# Altium footprint library 00.PcbLib: 150 footprints (part 2 of 10)
Each footprint in its own frame and in the unit in brackets; x right, y up, seen from the top. Pads: shape width x height; smd on the part's side, far side on the other; paste and mask are expansions set on the pad; w line width, h text height; cw(c..) or ccw(c..) is an arc to the next point about the centre after c.
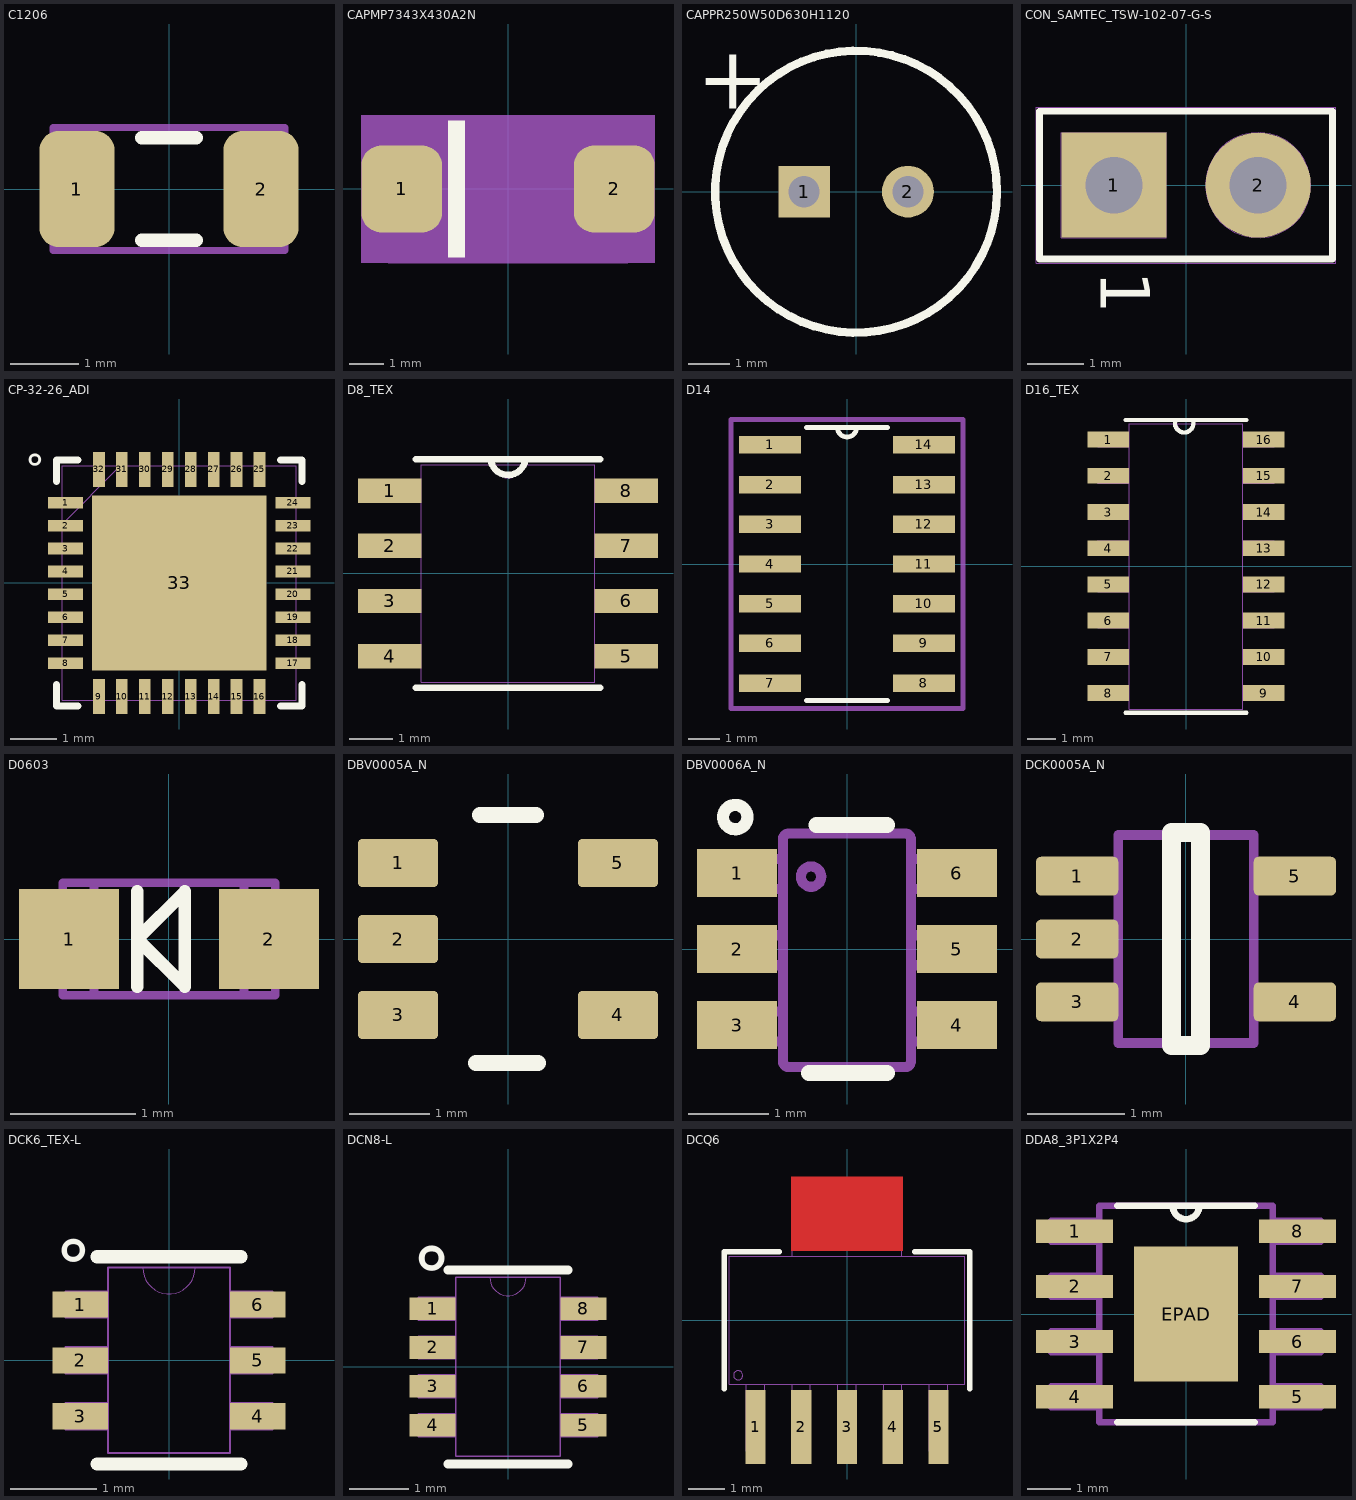
[diagram p1: the footprints below, top view; thin cyan lines are the x and y axes]

## C1206 [mm] "Chip Capacitor, Body 3.2x1.6mm, IPC High Density"
height 1.3
pads (2):
  rrect50% 1.1x1.7 smd: 1(-1.35,0) 2(1.35,0)
Top Overlay:
  lines w0.2: -0.4,-0.75 0.4,-0.75 ; -0.4,0.75 0.4,0.75
Top 3D Body:
  lines w0.1: -1.7,-0.9 -1.7,0.9 1.7,0.9 1.7,-0.9 -1.7,-0.9
3D body: height 1.3, standoff 0, extent -1.7,-0.9 1.7,0.9

## CAPMP7343X430A2N [mm] "CAPMP7343X430A2N"
pads (2):
  rrect50% 2.351x2.551 smd: 1(-3.1,0) 2(3.1,0)
Top Overlay:
  region: -1.25,-2 -1.25,2 -1.75,2 -1.75,-2
Top 3D Body:
  region: -3.65,1.2 -3.65,-1.2 -3.5,-1.2 -3.5,1.2
  region: 3.65,1.2 3.65,-1.2 3.5,-1.2 3.5,1.2
Top Component Outline (Mech100):
  dashed: -3.5,2.15 -3.5,-2.15 -2.5,-2.15 -2.5,2.15
  dashed: -4.275,-2.15 4.275,-2.15 4.275,2.15 -4.275,2.15
  lines w0.025: -3.5,-1.2 -3.55,-1.2 -3.65,-1.2 -3.65,1.2 -3.55,1.2 -3.5,1.2 ; 3.5,-1.2 3.55,-1.2 3.65,-1.2 3.65,1.2 3.55,1.2 3.5,1.2 ; -2.5,-2.15 3.5,-2.15 3.5,2.15 -2.5,2.15 ; -2.5,-2.15 -2.5,2.15 ; -2.5,-2.15 -3.5,-2.15 -3.5,2.15 -2.5,2.15
3D body: height 3.81, standoff 0, extent -3.65,-1.2 -3.5,1.2
3D body: height 3.81, standoff 0, extent 3.5,-1.2 3.65,1.2
3D body: height 3.81, standoff 0, extent -3.5,-2.15 3.5,2.15

## CAPPR250W50D630H1120 [mm]
pads (2):
  rect 1.25x1.25 hole 0.75: 1(-1.25,0)
  round 1.25 hole 0.75: 2(1.25,0)
Top Overlay:
  circle w0.2: c0,0 r3.4
  text "+" at -3.835,2.007 h1.52
3D body "CAPPR250W50D630H1120.stp": height 12.21, standoff -4.5, extent -3.4,-3.4 3.41,3.4

## CON_SAMTEC_TSW-102-07-G-S [mm]
pads (2):
  rect 1.85x1.85 / inner round 1.85 / far side rect 1.85x1.85 hole 1 mask+0.05: 1(-1.27,0)
  round 1.85 hole 1 mask+0.05: 2(1.27,0)
Top Overlay:
  lines w0.12: -2.58,-1.3 2.58,-1.3 2.58,1.3 -2.58,1.3 -2.58,-1.3
  text "1" at -1.795,-1.505 h1.5
Bottom 3D Body:
  circle w0.01: c1.27,0 r0.925
  lines w0.01: -2.64,-1.37 2.64,-1.37 2.64,1.37 -2.64,1.37 -2.64,-1.37 ; -2.195,-0.925 -2.195,0.925 -0.345,0.925 -0.345,-0.925 -2.195,-0.925
  text "1" at -1.525,-0.525 h1.5
3D body "TSW-102-07-G-S.stp": height 8.38, standoff -2.54, extent -2.667,-1.27 2.54,1.27
3D body: height 8.38, standoff 0, extent -2.579,-1.299 2.579,1.299

## CP-32-26_ADI [mil]
pads (33):
  rect 30x10 smd paste+0 mask+0: 1(-97.5,68.9) 2(-97.5,49.21) 3(-97.5,29.53) 4(-97.5,9.84) 5(-97.5,-9.84) 6(-97.5,-29.53) 7(-97.5,-49.21) 8(-97.5,-68.9) 17(97.5,-68.9) 18(97.5,-49.21) 19(97.5,-29.53) 20(97.5,-9.84) 21(97.5,9.84) 22(97.5,29.53) 23(97.5,49.21) 24(97.5,68.9)
  rect 10x30 smd paste+0 mask+0: 9(-68.9,-97.5) 10(-49.21,-97.5) 11(-29.53,-97.5) 12(-9.84,-97.5) 13(9.84,-97.5) 14(29.53,-97.5) 15(49.21,-97.5) 16(68.9,-97.5) 25(68.9,97.5) 26(49.21,97.5) 27(29.53,97.5) 28(9.84,97.5) 29(-9.84,97.5) 30(-29.53,97.5) 31(-49.21,97.5) 32(-68.9,97.5)
  rect 150x150 smd paste-74.5 mask+0: 33(0,0)
Top Overlay:
  lines w6: -105.5,-87 -105.5,-105.5 -87,-105.5 ; -105.5,87 -105.5,105.5 -87,105.5 ; 87,-105.5 105.5,-105.5 105.5,-87 ; 87,105.5 105.5,105.5 105.5,87
  text "。" at -130,95 h50
Top Paste:
  region: -28.94,71.06 -71.06,71.06 -71.06,28.94 -28.94,28.94
  region: -28.94,21.06 -71.06,21.06 -71.06,-21.06 -28.94,-21.06
  region: -28.94,-28.94 -71.06,-28.94 -71.06,-71.06 -28.94,-71.06
  region: 21.06,71.06 -21.06,71.06 -21.06,28.94 21.06,28.94
  region: 21.06,21.06 -21.06,21.06 -21.06,-21.06 21.06,-21.06
  region: 21.06,-28.94 -21.06,-28.94 -21.06,-71.06 21.06,-71.06
  region: 71.06,71.06 28.94,71.06 28.94,28.94 71.06,28.94
  region: 71.06,21.06 28.94,21.06 28.94,-21.06 71.06,-21.06
  region: 71.06,-28.94 28.94,-28.94 28.94,-71.06 71.06,-71.06
Top Component Outline (Mech100):
  lines w1: -100.5,50.5 -50.5,100.5 ; -100.5,-100.5 100.5,-100.5 100.5,100.5 -100.5,100.5 -100.5,-100.5 ; -100.5,-74.9 -100.5,-62.9 -100.5,-74.9 ; -100.5,-55.21 -100.5,-43.21 -100.5,-55.21 ; -100.5,-35.53 -100.5,-23.53 -100.5,-35.53 ; -100.5,-15.84 -100.5,-3.84 -100.5,-15.84 ; -100.5,3.84 -100.5,15.84 -100.5,3.84 ; -100.5,23.53 -100.5,35.53 -100.5,23.53 ; -100.5,43.21 -100.5,55.21 -100.5,43.21 ; -100.5,62.9 -100.5,74.9 -100.5,62.9 ; -74.9,-100.5 -62.9,-100.5 -74.9,-100.5 ; -74.9,100.5 -62.9,100.5 -74.9,100.5 ; -55.21,-100.5 -43.21,-100.5 -55.21,-100.5 ; -55.21,100.5 -43.21,100.5 -55.21,100.5 ; -35.53,-100.5 -23.53,-100.5 -35.53,-100.5 ; -35.53,100.5 -23.53,100.5 -35.53,100.5 ; -15.84,-100.5 -3.84,-100.5 -15.84,-100.5 ; -15.84,100.5 -3.84,100.5 -15.84,100.5 ; 3.84,-100.5 15.84,-100.5 3.84,-100.5 ; 3.84,100.5 15.84,100.5 3.84,100.5 ; 23.53,-100.5 35.53,-100.5 23.53,-100.5 ; 23.53,100.5 35.53,100.5 23.53,100.5 ; 43.21,-100.5 55.21,-100.5 43.21,-100.5 ; 43.21,100.5 55.21,100.5 43.21,100.5 ; 62.9,-100.5 74.9,-100.5 62.9,-100.5 ; 62.9,100.5 74.9,100.5 62.9,100.5 ; 100.5,-74.9 100.5,-62.9 100.5,-74.9 ; 100.5,-55.21 100.5,-43.21 100.5,-55.21 ; 100.5,-35.53 100.5,-23.53 100.5,-35.53 ; 100.5,-15.84 100.5,-3.84 100.5,-15.84 ; 100.5,3.84 100.5,15.84 100.5,3.84 ; 100.5,23.53 100.5,35.53 100.5,23.53 ; 100.5,43.21 100.5,55.21 100.5,43.21 ; 100.5,62.9 100.5,74.9 100.5,62.9
  text "*" at -95,53.74 h50

## D8_TEX [mil]
pads (8):
  rect 57.5x22 smd paste+0 mask+0: 1(-107.25,75) 2(-107.25,25) 3(-107.25,-25) 4(-107.25,-75) 5(107.25,-75) 6(107.25,-25) 7(107.25,25) 8(107.25,75)
Top Overlay:
  lines w5.98: -15.74,103.5 ccw(c0,105) 15,100
  lines w6: -83.5,-103.5 83.5,-103.5 ; -83.5,103.5 83.5,103.5
Top 3D Body:
  lines w0: -12,98.5 ccw(c0,98.5) 12,98.5
Top Component Outline (Mech100):
  lines w1: -122,-85 -78.5,-85 -78.5,-65 -122,-65 -122,-85 ; -122,-35 -78.5,-35 -78.5,-15 -122,-15 -122,-35 ; -122,15 -78.5,15 -78.5,35 -122,35 -122,15 ; -122,65 -78.5,65 -78.5,85 -122,85 -122,65 ; -78.5,-98.5 -78.5,98.5 78.5,98.5 78.5,-98.5 -78.5,-98.5 ; 78.5,-85 122,-85 122,-65 78.5,-65 78.5,-85 ; 78.5,-35 122,-35 122,-15 78.5,-15 78.5,-35 ; 78.5,15 122,15 122,35 78.5,35 78.5,15 ; 78.5,65 122,65 122,85 78.5,85 78.5,65
3D body "D0008A.stp": height 64, standoff 0, extent -118.55,-96.49 118.56,96.51

## D14 [mil]
pads (14):
  rect 78x22 smd: 1(-97,150) 2(-97,100) 3(-97,50) 4(-97,0) 5(-97,-50) 6(-97,-100) 7(-97,-150) 8(97,-150) 9(97,-100) 10(97,-50) 11(97,0) 12(97,50) 13(97,100) 14(97,150)
Top Overlay:
  lines w6: -50.89,-172 50.89,-172 ; -50.89,172 50.89,172 ; -12,172 ccw(c0,172) 12,172
Top 3D Body:
  lines w0: -12,172 ccw(c0,172) 12,172
Top Component Outline (Mech100):
  lines w6: -146,-182 -146,182 146,182 146,-182 -146,-182
3D body "D14.stp": height 69.1, standoff 0, extent -122,-172 122,172

## D16_TEX [mil]
pads (16):
  rect 57.5x22 smd paste+0 mask+0: 1(-107.25,175) 2(-107.25,125) 3(-107.25,75) 4(-107.25,25) 5(-107.25,-25) 6(-107.25,-75) 7(-107.25,-125) 8(-107.25,-175) 9(107.25,-175) 10(107.25,-125) 11(107.25,-75) 12(107.25,-25) 13(107.25,25) 14(107.25,75) 15(107.25,125) 16(107.25,175)
Top Overlay:
  lines w5.98: -14.43,202 ccw(c-2.5,197.5) 10,200
  lines w6: -83.5,-202 83.5,-202 ; -83.5,202 83.5,202
Top Component Outline (Mech100):
  lines w0: -12,197 ccw(c0,197) 12,197
  lines w1: -122,-185 -122,-165 -78.5,-165 -78.5,-185 -122,-185 ; -122,-135 -122,-115 -78.5,-115 -78.5,-135 -122,-135 ; -122,-85 -122,-65 -78.5,-65 -78.5,-85 -122,-85 ; -122,-35 -122,-15 -78.5,-15 -78.5,-35 -122,-35 ; -122,15 -122,35 -78.5,35 -78.5,15 -122,15 ; -122,65 -122,85 -78.5,85 -78.5,65 -122,65 ; -122,115 -122,135 -78.5,135 -78.5,115 -122,115 ; -122,165 -122,185 -78.5,185 -78.5,165 -122,165 ; -78.5,-197 78.5,-197 78.5,197 -78.5,197 -78.5,-197 ; 78.5,-185 78.5,-165 122,-165 122,-185 78.5,-185 ; 78.5,-135 78.5,-115 122,-115 122,-135 78.5,-135 ; 78.5,-85 78.5,-65 122,-65 122,-85 78.5,-85 ; 78.5,-35 78.5,-15 122,-15 122,-35 78.5,-35 ; 78.5,15 78.5,35 122,35 122,15 78.5,15 ; 78.5,65 78.5,85 122,85 122,65 78.5,65 ; 78.5,115 78.5,135 122,135 122,115 78.5,115 ; 78.5,165 78.5,185 122,185 122,165 78.5,165

## D0603 [mm]
pads (2):
  rect 0.8x0.8 smd: 1(-0.8,0) 2(0.8,0)
Top Overlay:
  lines w0.102: -0.254,-0.381 -0.254,0.381 ; -0.254,0 0.127,-0.381 0.127,0.381 -0.254,0
Top Component Outline (Mech100):
  lines w0.07: -0.6,-0.45 -0.6,0.45 ; 0.6,-0.45 0.6,0.45 ; -0.85,-0.45 0.85,-0.45 0.85,0.45 -0.85,0.45 -0.85,-0.45
3D body: height 0.35, standoff 0, extent -0.599,-0.449 0.599,0.449
3D body: height 0.36, standoff 0.35, extent -0.599,-0.449 0.599,0.449
3D body: height 0.35, standoff 0, extent -0.849,-0.449 -0.601,0.449
3D body: height 0.8, standoff 0.35, extent -0.599,-0.449 0.599,0.449
3D body: height 0.35, standoff 0, extent 0.601,-0.449 0.849,0.449

## DBV0005A_N [mm]
pads (5):
  rrect17% 1x0.6 smd: 1(-1.375,0.95) 2(-1.375,0) 3(-1.375,-0.95) 4(1.375,-0.95) 5(1.375,0.95)
Top Overlay:
  lines w0.2: -0.4,-1.55 0.375,-1.55 ; -0.35,1.55 0.35,1.55
3D body "DBV0005A.stp": height 1.09, standoff 0, extent -1.422,-1.461 1.423,1.46

## DBV0006A_N [mm]
pads (6):
  rect 1x0.6 smd paste+0 mask+0.051: 1(-1.375,0.95) 2(-1.375,0) 3(-1.375,-0.95) 4(1.375,-0.95) 5(1.375,0) 6(1.375,0.95)
Top Overlay:
  circle w0.152: c-1.397,1.651 r0.152
  lines w0.2: -0.475,-1.55 0.5,-1.55 ; -0.381,1.55 0.5,1.55
Top Component Outline (Mech100):
  lines w0.127: 0.724,-1.475 ccw(c0.723,-1.399) 0.8,-1.399 0.8,1.37 ccw(c0.723,1.37) 0.724,1.446 ; 0.723,-1.475 -0.724,-1.475 -0.725,-1.475 cw(c-0.724,-1.399) -0.801,-1.399 -0.801,1.37 cw(c-0.724,1.37) -0.725,1.446 -0.724,1.446 0.723,1.446 ; 0.723,-1.475 0.724,-1.475 ; 0.723,1.446 0.724,1.446 ; -1.423,-1.154 -1.423,-0.78 -1.206,-0.78 -1.113,-0.78 -1.081,-0.78 -0.828,-0.78 -0.801,-0.78 -0.801,-1.154 -0.828,-1.154 -1.081,-1.154 -1.113,-1.154 -1.206,-1.154 -1.423,-1.154 ; -1.423,-0.202 -1.423,0.173 -1.206,0.173 -1.113,0.173 -1.081,0.173 -0.828,0.173 -0.801,0.173 -0.801,-0.202 -0.828,-0.202 -1.081,-0.202 -1.113,-0.202 -1.206,-0.202 -1.423,-0.202 ; -1.423,0.751 -1.423,1.125 -1.206,1.125 -1.113,1.125 -1.081,1.125 -0.828,1.125 -0.801,1.125 -0.801,0.751 -0.828,0.751 -1.081,0.751 -1.113,0.751 -1.206,0.751 -1.423,0.751 ; -0.577,0.906 cw(c-0.45,0.906) -0.323,0.906 cw(c-0.45,0.906) -0.577,0.906 ; 0.8,-1.154 0.8,-0.78 0.827,-0.78 1.08,-0.78 1.112,-0.78 1.205,-0.78 1.422,-0.78 1.422,-1.154 1.205,-1.154 1.112,-1.154 1.08,-1.154 0.827,-1.154 0.8,-1.154 ; 0.8,-0.202 0.8,0.173 0.827,0.173 1.08,0.173 1.112,0.173 1.205,0.173 1.422,0.173 1.422,-0.202 1.205,-0.202 1.112,-0.202 1.08,-0.202 0.827,-0.202 0.8,-0.202 ; 0.8,0.751 0.8,1.125 0.827,1.125 1.08,1.125 1.112,1.125 1.205,1.125 1.422,1.125 1.422,0.751 1.205,0.751 1.112,0.751 1.08,0.751 0.827,0.751 0.8,0.751
3D body "DDC0006A.stp": height 0.92, standoff 0, extent -1.434,-1.485 1.434,1.485

## DCK0005A_N [mm]
pads (5):
  rrect25% 0.85x0.4 smd: 1(-1.125,0.65) 2(-1.125,0) 3(-1.125,-0.65) 4(1.125,-0.65) 5(1.125,0.65)
Top Overlay:
  lines w0.2: -0.15,-1.1 0.15,-1.1 0.15,1.1 -0.15,1.1 -0.15,-1.1
Top Component Outline (Mech100):
  lines w0.1: -0.7,-1.075 0.7,-1.075 0.7,1.075 -0.7,1.075 -0.7,-1.075
3D body: height 1, standoff 0, extent -0.711,-1.067 0.711,1.067

## DCK6_TEX-L [mil]
pads (6):
  rect 25.5x12 smd paste+0 mask+0: 1(-40.75,25.59) 2(-40.75,0) 3(-40.75,-25.59) 4(40.75,-25.59) 5(40.75,0) 6(40.75,25.59)
Top Overlay:
  lines w6: -33,-47.5 33,-47.5 ; -33,47.5 33,47.5
  text "。" at -50,40 h50
Top Component Outline (Mech100):
  lines w0: -12,42.5 ccw(c0,42.5) 12,42.5
  lines w1: -47.5,-31.59 -28,-31.59 -28,-19.59 -47.5,-19.59 -47.5,-31.59 ; -47.5,-6 -28,-6 -28,6 -47.5,6 -47.5,-6 ; -47.5,19.59 -28,19.59 -28,31.59 -47.5,31.59 -47.5,19.59 ; -28,-42.5 -28,42.5 28,42.5 28,-42.5 -28,-42.5 ; 28,-31.59 47.5,-31.59 47.5,-19.59 28,-19.59 28,-31.59 ; 28,-6 47.5,-6 47.5,6 28,6 28,-6 ; 28,19.59 47.5,19.59 47.5,31.59 28,31.59 28,19.59

## DCN8-L [mil]
pads (8):
  rect 30.5x15 smd paste+0 mask+0: 1(-49.75,38.39) 2(-49.75,12.8) 3(-49.75,-12.8) 4(-49.75,-38.39) 5(49.75,-38.39) 6(49.75,-12.8) 7(49.75,12.8) 8(49.75,38.39)
Top Overlay:
  lines w6: -39.5,-64 39.5,-64 ; -39.5,64 39.5,64
  text "。" at -60,55 h78.74
Top Component Outline (Mech100):
  lines w0: -12,59 ccw(c0,59) 12,59
  lines w1: -59,-45.89 -34.5,-45.89 -34.5,-30.89 -59,-30.89 -59,-45.89 ; -59,-20.3 -34.5,-20.3 -34.5,-5.3 -59,-5.3 -59,-20.3 ; -59,5.3 -34.5,5.3 -34.5,20.3 -59,20.3 -59,5.3 ; -59,30.89 -34.5,30.89 -34.5,45.89 -59,45.89 -59,30.89 ; -34.5,-59 34.5,-59 34.5,59 -34.5,59 -34.5,-59 ; 34.5,-45.89 59,-45.89 59,-30.89 34.5,-30.89 34.5,-45.89 ; 34.5,-20.3 59,-20.3 59,-5.3 34.5,-5.3 34.5,-20.3 ; 34.5,5.3 59,5.3 59,20.3 34.5,20.3 34.5,5.3 ; 34.5,30.89 59,30.89 59,45.89 34.5,45.89 34.5,30.89

## DCQ6 [mil]
pads (5):
  rect 22x81 smd: 1(-100,-116.5) 2(-50,-116.5) 3(0,-116.5) 4(50,-116.5) 5(100,-116.5)
Top Layer:
  region: 61,76 61,157 -61,157 -61,76
Top Overlay:
  lines w6: -134,-75 -134,75 -74.06,75 ; 74.06,75 134,75 134,-75
Top Paste:
  region: 61,76 61,157 -61,157 -61,76
Top Solder:
  region: 62,62 62,171 -62,171 -62,62
Top Component Outline (Mech100):
  circle w0: c-119,-60 r5
  lines w1: -129,-70 -129,70 129,70 129,-70 -129,-70 ; -110,-143 -90,-143 -90,-70 -110,-70 -110,-143 ; -60,-143 -40,-143 -40,-70 -60,-70 -60,-143 ; -60,70 -60,143 60,143 60,70 -60,70 ; -10,-143 -10,-70 10,-70 10,-143 -10,-143 ; 40,-143 60,-143 60,-70 40,-70 40,-143 ; 90,-143 110,-143 110,-70 90,-70 90,-143
3D body: height 10, standoff 0, extent -130,-70 130,70

## DDA8_3P1X2P4 [mil]
pads (9):
  rect 70x21 smd: 1(-101,75) 2(-101,25) 3(-101,-25) 4(-101,-75) 5(101,-75) 6(101,-25) 7(101,25) 8(101,75)
  rect 94.49x122.05 smd paste-60.52 mask+0: EPAD(0,0)
Top Overlay:
  lines w6: -62.08,-98 62.08,-98 ; -62.08,98 62.08,98 ; -12,98 ccw(c0,98) 12,98
Top Paste:
  region: 43.31,-3.94 -43.31,-3.94 -43.31,-57.09 43.31,-57.09
  region: 43.31,57.09 -43.31,57.09 -43.31,3.94 43.31,3.94
Top Component Outline (Mech100):
  lines w0: -12,98 ccw(c0,98) 12,98
  lines w5.98: -122,-84.5 -122,-65.5 -78.5,-65.5 -78.5,-84.5 -122,-84.5 ; -122,-34.5 -78.5,-34.5 -78.5,-15.5 -122,-15.5 -122,-34.5 ; -122,15.5 -78.5,15.5 -78.5,34.5 -122,34.5 -122,15.5 ; -122,65.5 -78.5,65.5 -78.5,84.5 -122,84.5 -122,65.5 ; -78.5,-98 -78.5,98 78.5,98 78.5,-98 -78.5,-98 ; 78.5,-84.5 122,-84.5 122,-65.5 78.5,-65.5 78.5,-84.5 ; 78.5,-34.5 122,-34.5 122,-15.5 78.5,-15.5 78.5,-34.5 ; 78.5,15.5 122,15.5 122,34.5 78.5,34.5 78.5,15.5 ; 78.5,65.5 122,65.5 122,84.5 78.5,84.5 78.5,65.5
3D body: height 78.74, standoff 0, extent -80,-100 80,100